# Altium footprint library self_pcblib v1.8.6.PcbLib: 164 footprints (part 1 of 11)
Each footprint in its own frame and in the unit in brackets; x right, y up, seen from the top. Pads: shape width x height; smd on the part's side, far side on the other; paste and mask are expansions set on the pad; w line width, h text height; cw(c..) or ccw(c..) is an arc to the next point about the centre after c.
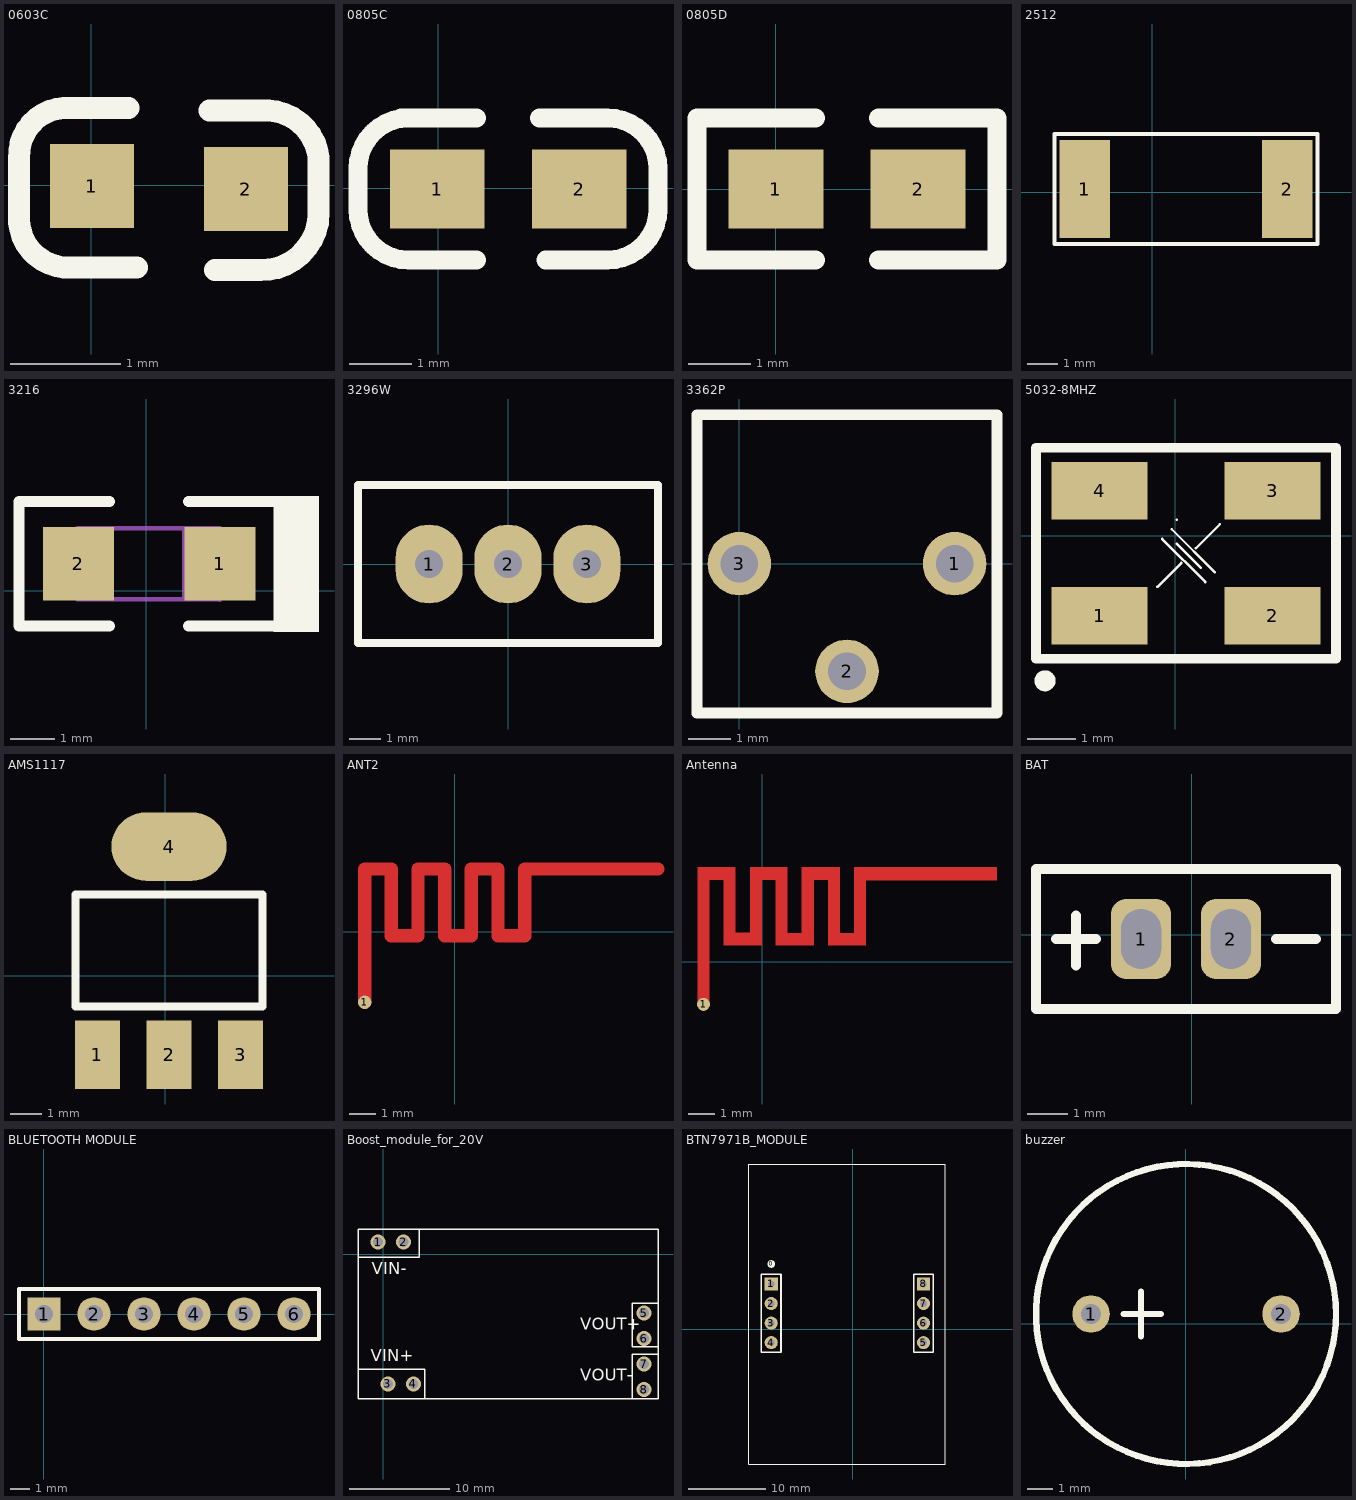
[diagram p0: the footprints below, top view; thin cyan lines are the x and y axes]

## 0603C [mil]
pads (2):
  rect 30x30 smd: 1(0.21,-0.35) 2(55.21,-1.35)
Top Overlay:
  lines w7.87: 13.21,27.65 -9.79,27.65 ccw(c-8.79,10.65) -25.79,9.65 -25.79,-10.35 ccw(c-8.29,-11.85) -9.79,-29.35 16.21,-29.35 ; 42.21,26.65 60.21,26.65 cw(c62.21,7.65) 81.21,9.65 81.21,-10.35 cw(c60.71,-9.85) 60.21,-30.35 44.21,-30.35
3D body "0603 SMD Capacitor.STEP": height 11.89, standoff 0, extent -1.49,-14.99 61.5,16.5

## 0805C [mil]
pads (2):
  rect 60x50 smd: 1(-0.71,-0.4) 2(89.29,-0.4)
Top Overlay:
  lines w12: -50.85,-13.26 ccw(c-18.71,-13.26) -18.71,-45.4 24.29,-45.4 ; -50.85,-12.26 -50.85,12.6 cw(c-18.71,12.6) -18.71,44.74 ; -23.71,44.6 24.29,44.6 ; 64.29,44.6 107.29,44.6 ; 68.15,-45.4 107.15,-45.4 ccw(c107.15,-13.26) 139.29,-13.26 139.29,11.6 ; 107.15,44.74 cw(c107.15,12.6) 139.29,12.6
3D body "0805 SMD Capacitor.STEP": height 30.79, standoff 0, extent 5.64,-24.6 84.37,24.61

## 0805D [mil]
pads (2):
  rect 60x50 smd: 1(0,0) 2(90,0)
Top Overlay:
  lines w12: 25,-45 -50,-45 -50,45 25,45 ; 65,-45 140,-45 140,45 65,45
3D body "RES0805.STEP": height 15, standoff -1.14, extent 1.26,-24.6 80,24.61

## 2512 [mm]
pads (2):
  rect 1.65x3.2 smd: 1(-2.2,0.1) 2(4.4,0.1)
Top Overlay:
  lines w0.127: -3.2,-1.7 5.4,-1.7 5.4,1.9 -3.2,1.9 -3.2,-1.7

## 3216 [mm]
pads (2):
  rect 1.6x1.65 smd: 1(1.659,0.608) 2(-1.516,0.608)
Top Overlay:
  rectangle: 2.866,-0.929 3.882,2.132
  lines w0.254: -0.817,-0.789 -2.849,-0.789 -2.849,2.005 -0.817,2.005 ; 0.961,-0.789 2.866,-0.789 ; 0.961,2.005 2.866,2.005
Mechanical 1:
  lines w0.1: -1.567,-0.002 -1.719,-0.002 -1.719,1.116 -1.541,1.116 ; 0.859,-0.192 0.859,1.408 ; 1.659,-0.205 1.659,-0.027 ; 1.659,-0.192 -1.541,-0.192 -1.541,1.408 1.659,1.408 1.659,-0.027 ; 1.684,1.116 1.862,1.116 1.837,1.091 1.837,-0.027 1.659,-0.027
3D body "3216-_A_钽电容.step": height 1.8, standoff 0, extent -1.692,-0.332 1.708,1.468

## 3296W [mil]
pads (3):
  oval 85x100 hole 35: 1(-100,0) 2(0,0) 3(100,0)
Top Overlay:
  lines w10: -190,-100 -190,100 190,100 190,-100 -190,-100
3D body "User Library-3296W.step": height 454.72, standoff -62.99, extent -187.6,-94.49 187.6,94.49

## 3362P [mm]
pads (3):
  round 1.5 hole 0.889: 1(5.08,0) 2(2.54,-2.54) 3(0,0)
Top Overlay:
  lines w0.254: -1,-3.531 -1,3.516 ; -1,-3.524 6.08,-3.524 ; -0.991,3.516 6.08,3.516 6.08,-3.505
3D body "3362P.STEP": height 4.7, standoff -5.47, extent -0.76,-3.3 5.84,3.754

## 5032-8MHZ [mm]
pads (4):
  rect 2x1.2 smd: 1(-1.568,-1.667) 2(2.032,-1.667) 3(2.032,0.933) 4(-1.568,0.933)
Top Overlay:
  circle w0.254: c-2.708,-3.023 r0.092
  lines w0.051: -0.368,-1.067 0.132,-0.567 ; -0.268,-0.067 0.632,-0.967 ; -0.068,0.133 0.832,-0.767 ; 0.032,-0.167 0.532,-0.667 ; 0.432,-0.267 0.932,0.233 ; 0.132,-0.567 0.132,-0.567 ; 0.932,0.233 0.932,0.233 ; 0.032,0.333 0.032,0.333
  lines w0.203: -2.896,-2.565 -2.896,1.829 3.353,1.829 3.353,-2.565 -2.896,-2.565
3D body "User Library-crystal_smd_52x34x1.STEP": height 1, standoff 0, extent -2.371,-2.083 2.829,1.317

## AMS1117 [mm]
pads (4):
  rect 1.45x2.2 smd: 1(-2.173,-2.54) 2(0.127,-2.54) 3(2.427,-2.54)
  oval 3.7x2.2 smd: 4(0.127,4.155)
Top Overlay:
  lines w0.254: -2.873,-0.992 -2.873,2.607 3.127,2.607 3.127,-0.992 -2.873,-0.992
3D body "User Library-AMS1117.STEP": height 1.85, standoff -0.01, extent -3.175,-2.763 3.325,4.237

## ANT2 [mm]
pads (1):
  round 0.5 smd: 1(-3.378,-2.642)
Top Layer:
  lines w0.5: -3.378,-2.642 -3.378,2.358 -2.378,2.358 -2.378,-0.142 -1.378,-0.142 -1.378,2.318 ; -1.378,2.358 -0.378,2.358 -0.378,-0.142 0.622,-0.142 0.622,2.348 ; 0.622,2.358 1.622,2.358 1.622,-0.142 2.622,-0.142 2.622,2.358 7.622,2.358

## Antenna [mm]
pads (1):
  round 0.5 smd: 1(-2.261,-1.626)
Top Layer:
  rectangle: -2.489,-1.626 -2.032,3.632
  rectangle: -2.489,3.15 -1.067,3.632
  rectangle: -1.499,0.635 -1.041,3.632
  rectangle: -1.499,0.635 -0.025,1.121
  rectangle: -0.483,0.635 -0.025,3.628
  rectangle: 0.508,0.635 0.965,3.632
  rectangle: 1.499,0.635 1.981,3.632
  rectangle: 2.515,0.635 2.972,3.632
  rectangle: 3.505,0.635 3.962,3.632
  rectangle: -0.483,3.15 0.965,3.632
  rectangle: 0.508,0.635 1.93,1.118
  rectangle: 1.524,3.15 2.946,3.632
  rectangle: 2.515,0.635 3.937,1.118
  rectangle: 3.505,3.124 8.992,3.632

## BAT [mm]
pads (2):
  rrect50% 1.5x2 hole 1 slot 1.5 at 90 deg: 1(-1.27,-0.102) 2(0.976,-0.102)
Top Overlay:
  lines w0.25: -3.397,-0.102 -2.397,-0.102 ; -2.897,-0.77 -2.897,0.48 ; 2.103,-0.102 3.103,-0.102 ; -3.897,-1.852 -3.897,1.648 3.603,1.648 3.603,-1.852 -3.897,-1.852

## BLUETOOTH MODULE [mm] "蓝牙模块"
pads (6):
  rect 1.7x1.7 hole 0.9: 1(0,0)
  round 1.7 hole 0.9: 2(2.54,0) 3(5.08,0) 4(7.62,0) 5(10.16,0) 6(12.7,0)
Top Overlay:
  lines w0.2: -1.27,-1.27 -1.27,1.27 13.97,1.27 13.97,-1.27 -1.27,-1.27
3D body "HDR2.54-1P_M.STEP": height 8.5, standoff -3, extent 8.89,-1.27 11.43,1.27
3D body "HDR2.54-1P_M.STEP": height 8.5, standoff -3, extent 6.35,-1.27 8.89,1.27
3D body "HDR2.54-1P_M.STEP": height 8.5, standoff -3, extent 11.43,-1.27 13.97,1.27
3D body "HDR2.54-1P_M.STEP": height 8.5, standoff -3, extent 1.27,-1.27 3.81,1.27
3D body "HDR2.54-1P_M.STEP": height 8.5, standoff -3, extent -1.27,-1.27 1.27,1.27
3D body "HDR2.54-1P_M.STEP": height 8.5, standoff -3, extent 3.81,-1.27 6.35,1.27
3D body "User Library-HM-10.STEP": height 45.75, standoff 3.87, extent -1.65,-6.6 14.45,0.225

## Boost_module_for_20V [mil] "20V/5A升压模块"
pads (8):
  round 60 hole 39: 1(-19.68,47.24) 2(80.71,47.24) 3(19.68,-511.81) 4(120.08,-511.81) 5(1027.56,-232.28) 6(1027.56,-332.68) 7(1027.56,-433.07) 8(1027.56,-533.46)
Top Overlay:
  lines w5: -98.43,-452.76 165.35,-452.76 165.35,-570.87 ; -98.43,-11.81 141.73,-11.81 141.73,98.43 ; 980.92,-570.87 980.92,-393.7 1082.68,-393.7 ; 1082.68,-366.14 980.32,-366.14 980.32,-192.91 1082.68,-192.91 ; -98.43,-570.87 1082.68,-570.87 1082.68,98.43 -98.43,98.43 -98.43,-570.87
  text "VIN-" at -43.31,-94.49 h80
  text "VIN+" at -47.24,-437.01 h80
  text "VOUT+" at 775.59,-314.96 h80
  text "VOUT-" at 775.59,-515.75 h80

## BTN7971B_MODULE [mm] "BTN电机驱动模块"
pads (9):
  round 1 on Top Overlay: 0(-10.6,8.5)
  rect 1.7x1.7 hole 0.9: 1(-10.6,5.9) 8(9.2,5.9)
  round 1.7 hole 0.9: 2(-10.6,3.36) 3(-10.6,0.82) 4(-10.6,-1.72) 5(9.2,-1.72) 6(9.2,0.82) 7(9.2,3.36)
Top Overlay:
  lines w0.127: -13.5,-17.5 -13.5,21.5 12,21.5 12,-17.5 -13.5,-17.5
  lines w0.2: -11.87,-2.99 -9.33,-2.99 -9.33,7.17 -11.87,7.17 -11.87,-2.99 ; 7.93,-2.99 10.47,-2.99 10.47,7.17 7.93,7.17 7.93,-2.99
3D body "HDR2.54-1P_M.STEP": height 8.5, standoff -3, extent 7.93,-0.45 10.47,2.09
3D body "HDR2.54-1P_M.STEP": height 8.5, standoff -3, extent 7.93,-2.99 10.47,-0.45
3D body "HDR2.54-1P_M.STEP": height 8.5, standoff -3, extent 7.93,4.63 10.47,7.17
3D body "HDR2.54-1P_M.STEP": height 8.5, standoff -3, extent 7.93,2.09 10.47,4.63
3D body "HDR2.54-1P_M.STEP": height 8.5, standoff -3, extent -11.87,-0.45 -9.33,2.09
3D body "HDR2.54-1P_M.STEP": height 8.5, standoff -3, extent -11.87,-2.99 -9.33,-0.45
3D body "HDR2.54-1P_M.STEP": height 8.5, standoff -3, extent -11.87,4.63 -9.33,7.17
3D body "HDR2.54-1P_M.STEP": height 8.5, standoff -3, extent -11.87,2.09 -9.33,4.63

## buzzer [mm]
pads (2):
  round 1.5 hole 0.8: 1(-3.79,0.381) 2(3.81,0.381)
Top Overlay:
  circle w0.254: c0.009,0.381 r6.001
  lines w0.254: -2.49,0.381 -0.99,0.381 ; -1.79,-0.519 -1.79,1.281
3D body "User Library-WST-1203UX.STEP": height 9.65, standoff -4.5, extent -9.454,-5.822 6,6.178